# Altium footprint library 7-Connectors-12.PcbLib: 76 footprints (part 2 of 5) (continued)
## DIPS28-600 [mm] "DIP Socket 28 Leads, Row Spacing 15.24mm; Pitch 2.54mm"
height 4.2
pads (28):
  rect 1.5x1.5 hole 0.9: 1(-7.62,16.51)
  round 1.5 hole 0.9: 2(-7.62,13.97) 3(-7.62,11.43) 4(-7.62,8.89) 5(-7.62,6.35) 6(-7.62,3.81) 7(-7.62,1.27) 8(-7.62,-1.27) 9(-7.62,-3.81) 10(-7.62,-6.35) 11(-7.62,-8.89) 12(-7.62,-11.43) 13(-7.62,-13.97) 14(-7.62,-16.51) 15(7.62,-16.51) 16(7.62,-13.97) 17(7.62,-11.43) 18(7.62,-8.89) 19(7.62,-6.35) 20(7.62,-3.81) 21(7.62,-1.27) 22(7.62,1.27) 23(7.62,3.81) 24(7.62,6.35) 25(7.62,8.89) 26(7.62,11.43) 27(7.62,13.97) 28(7.62,16.51)
Top Overlay:
  lines w0.2: -5.14,-17.78 -5.14,17.78 ; -5.14,-14.88 5.36,-14.88 ; -5.14,-1.45 5.36,-1.45 ; -5.14,1.45 5.36,1.45 ; -5.14,14.88 5.36,14.88 ; 5.36,-17.78 5.36,17.78 ; -8.85,-17.78 8.85,-17.78 8.85,17.78 -1.23,17.78 cw(c-2.43,17.78) -3.63,17.78 -8.85,17.78 -8.85,-17.78
Mechanical 8:
  lines w0.1: -8.12,-16.51 -7.62,-16.51 ; -8.12,-13.97 -7.62,-13.97 ; -8.12,-11.43 -7.62,-11.43 ; -8.12,-8.89 -7.62,-8.89 ; -8.12,-6.35 -7.62,-6.35 ; -8.12,-3.81 -7.62,-3.81 ; -8.12,-1.27 -7.62,-1.27 ; -8.12,1.27 -7.62,1.27 ; -8.12,3.81 -7.62,3.81 ; -8.12,6.35 -7.62,6.35 ; -8.12,8.89 -7.62,8.89 ; -8.12,11.43 -7.62,11.43 ; -8.12,13.97 -7.62,13.97 ; -8.12,16.51 -7.62,16.51 ; -7.62,-17.01 -7.62,-16.51 ; -7.62,-16.01 -7.62,-16.51 ; -7.62,-14.47 -7.62,-13.97 ; -7.62,-13.47 -7.62,-13.97 ; -7.62,-11.93 -7.62,-11.43 ; -7.62,-10.93 -7.62,-11.43 ; -7.62,-9.39 -7.62,-8.89 ; -7.62,-8.39 -7.62,-8.89 ; -7.62,-6.85 -7.62,-6.35 ; -7.62,-5.85 -7.62,-6.35 ; -7.62,-4.31 -7.62,-3.81 ; -7.62,-3.31 -7.62,-3.81 ; -7.62,-1.77 -7.62,-1.27 ; -7.62,-0.77 -7.62,-1.27 ; -7.62,0.77 -7.62,1.27 ; -7.62,1.77 -7.62,1.27 ; -7.62,3.31 -7.62,3.81 ; -7.62,4.31 -7.62,3.81 ; -7.62,5.85 -7.62,6.35 ; -7.62,6.85 -7.62,6.35 ; -7.62,8.39 -7.62,8.89 ; -7.62,9.39 -7.62,8.89 ; -7.62,10.93 -7.62,11.43 ; -7.62,11.93 -7.62,11.43 ; -7.62,13.47 -7.62,13.97 ; -7.62,14.47 -7.62,13.97 ; -7.62,16.01 -7.62,16.51 ; -7.62,17.01 -7.62,16.51 ; -7.12,-16.51 -7.62,-16.51 ; -7.12,-13.97 -7.62,-13.97 ; -7.12,-11.43 -7.62,-11.43 ; -7.12,-8.89 -7.62,-8.89 ; -7.12,-6.35 -7.62,-6.35 ; -7.12,-3.81 -7.62,-3.81 ; -7.12,-1.27 -7.62,-1.27 ; -7.12,1.27 -7.62,1.27 ; -7.12,3.81 -7.62,3.81 ; -7.12,6.35 -7.62,6.35 ; -7.12,8.89 -7.62,8.89 ; -7.12,11.43 -7.62,11.43 ; -7.12,13.97 -7.62,13.97 ; -7.12,16.51 -7.62,16.51 ; -0.5,0 0,0 ; 0,-0.5 0,0 ; 0,0.5 0,0 ; 0.5,0 0,0 ; 7.12,-16.51 7.62,-16.51 ; 7.12,-13.97 7.62,-13.97 ; 7.12,-11.43 7.62,-11.43 ; 7.12,-8.89 7.62,-8.89 ; 7.12,-6.35 7.62,-6.35 ; 7.12,-3.81 7.62,-3.81 ; 7.12,-1.27 7.62,-1.27 ; 7.12,1.27 7.62,1.27 ; 7.12,3.81 7.62,3.81 ; 7.12,6.35 7.62,6.35 ; 7.12,8.89 7.62,8.89 ; 7.12,11.43 7.62,11.43 ; 7.12,13.97 7.62,13.97 ; 7.12,16.51 7.62,16.51 ; 7.62,-17.01 7.62,-16.51 ; 7.62,-16.01 7.62,-16.51 ; 7.62,-14.47 7.62,-13.97 ; 7.62,-13.47 7.62,-13.97 ; 7.62,-11.93 7.62,-11.43 ; 7.62,-10.93 7.62,-11.43 ; 7.62,-9.39 7.62,-8.89 ; 7.62,-8.39 7.62,-8.89 ; 7.62,-6.85 7.62,-6.35 ; 7.62,-5.85 7.62,-6.35 ; 7.62,-4.31 7.62,-3.81 ; 7.62,-3.31 7.62,-3.81 ; 7.62,-1.77 7.62,-1.27 ; 7.62,-0.77 7.62,-1.27 ; 7.62,0.77 7.62,1.27 ; 7.62,1.77 7.62,1.27 ; 7.62,3.31 7.62,3.81 ; 7.62,4.31 7.62,3.81 ; 7.62,5.85 7.62,6.35 ; 7.62,6.85 7.62,6.35 ; 7.62,8.39 7.62,8.89 ; 7.62,9.39 7.62,8.89 ; 7.62,10.93 7.62,11.43 ; 7.62,11.93 7.62,11.43 ; 7.62,13.47 7.62,13.97 ; 7.62,14.47 7.62,13.97 ; 7.62,16.01 7.62,16.51 ; 7.62,17.01 7.62,16.51 ; 8.12,-16.51 7.62,-16.51 ; 8.12,-13.97 7.62,-13.97 ; 8.12,-11.43 7.62,-11.43 ; 8.12,-8.89 7.62,-8.89 ; 8.12,-6.35 7.62,-6.35 ; 8.12,-3.81 7.62,-3.81 ; 8.12,-1.27 7.62,-1.27 ; 8.12,1.27 7.62,1.27 ; 8.12,3.81 7.62,3.81 ; 8.12,6.35 7.62,6.35 ; 8.12,8.89 7.62,8.89 ; 8.12,11.43 7.62,11.43 ; 8.12,13.97 7.62,13.97 ; 8.12,16.51 7.62,16.51
Mechanical 14:
  lines w0.1: -5.14,-17.78 -5.14,17.78 ; -5.14,-14.88 5.36,-14.88 ; -5.14,-1.45 5.36,-1.45 ; -5.14,1.45 5.36,1.45 ; -5.14,14.88 5.36,14.88 ; 5.36,-17.78 5.36,17.78 ; -8.85,-17.78 8.85,-17.78 8.85,17.78 -1.23,17.78 cw(c-2.43,17.78) -3.63,17.78 -8.85,17.78 -8.85,-17.78
3D body "DIPS28-600.stp": height 4.2, standoff -3.17, extent -8.85,-17.78 8.85,17.78

## DIPS32-600 [mm] "DIP Socket 28 Leads, Row Spacing 15.24mm; Pitch 2.54mm"
height 4.2
pads (32):
  rect 1.5x1.5 hole 0.9: 1(-7.62,19.05)
  round 1.5 hole 0.9: 2(-7.62,16.51) 3(-7.62,13.97) 4(-7.62,11.43) 5(-7.62,8.89) 6(-7.62,6.35) 7(-7.62,3.81) 8(-7.62,1.27) 9(-7.62,-1.27) 10(-7.62,-3.81) 11(-7.62,-6.35) 12(-7.62,-8.89) 13(-7.62,-11.43) 14(-7.62,-13.97) 15(-7.62,-16.51) 16(-7.62,-19.05) 17(7.62,-19.05) 18(7.62,-16.51) 19(7.62,-13.97) 20(7.62,-11.43) 21(7.62,-8.89) 22(7.62,-6.35) 23(7.62,-3.81) 24(7.62,-1.27) 25(7.62,1.27) 26(7.62,3.81) 27(7.62,6.35) 28(7.62,8.89) 29(7.62,11.43) 30(7.62,13.97) 31(7.62,16.51) 32(7.62,19.05)
Top Overlay:
  lines w0.2: -5.14,-1.45 5.36,-1.45 ; -5.14,1.45 5.36,1.45 ; -5.14,17.42 5.36,17.42 ; -5.14,20.32 -5.14,-17.42 5.36,-17.42 5.36,20.32 ; -8.85,-20.32 8.85,-20.32 8.85,20.32 -1.23,20.32 cw(c-2.43,20.32) -3.63,20.32 -8.85,20.32 -8.85,-20.32
Mechanical 8:
  lines w0.1: -8.12,-19.05 -7.62,-19.05 ; -8.12,-16.51 -7.62,-16.51 ; -8.12,-8.89 -7.62,-8.89 ; -8.12,-6.35 -7.62,-6.35 ; -8.12,-3.81 -7.62,-3.81 ; -8.12,-1.27 -7.62,-1.27 ; -8.12,1.27 -7.62,1.27 ; -8.12,3.81 -7.62,3.81 ; -8.12,6.35 -7.62,6.35 ; -8.12,8.89 -7.62,8.89 ; -8.12,11.43 -7.62,11.43 ; -8.12,13.97 -7.62,13.97 ; -8.12,16.51 -7.62,16.51 ; -8.12,19.05 -7.62,19.05 ; -7.62,-19.55 -7.62,-19.05 ; -7.62,-18.55 -7.62,-19.05 ; -7.62,-17.01 -7.62,-16.51 ; -7.62,-16.01 -7.62,-16.51 ; -7.62,-9.39 -7.62,-8.89 ; -7.62,-8.39 -7.62,-8.89 ; -7.62,-6.85 -7.62,-6.35 ; -7.62,-5.85 -7.62,-6.35 ; -7.62,-4.31 -7.62,-3.81 ; -7.62,-3.31 -7.62,-3.81 ; -7.62,-1.77 -7.62,-1.27 ; -7.62,-0.77 -7.62,-1.27 ; -7.62,0.77 -7.62,1.27 ; -7.62,1.77 -7.62,1.27 ; -7.62,3.31 -7.62,3.81 ; -7.62,4.31 -7.62,3.81 ; -7.62,5.85 -7.62,6.35 ; -7.62,6.85 -7.62,6.35 ; -7.62,8.39 -7.62,8.89 ; -7.62,9.39 -7.62,8.89 ; -7.62,10.93 -7.62,11.43 ; -7.62,11.93 -7.62,11.43 ; -7.62,13.47 -7.62,13.97 ; -7.62,14.47 -7.62,13.97 ; -7.62,16.01 -7.62,16.51 ; -7.62,17.01 -7.62,16.51 ; -7.62,18.55 -7.62,19.05 ; -7.62,19.55 -7.62,19.05 ; -7.12,-19.05 -7.62,-19.05 ; -7.12,-16.51 -7.62,-16.51 ; -7.12,-8.89 -7.62,-8.89 ; -7.12,-6.35 -7.62,-6.35 ; -7.12,-3.81 -7.62,-3.81 ; -7.12,-1.27 -7.62,-1.27 ; -7.12,1.27 -7.62,1.27 ; -7.12,3.81 -7.62,3.81 ; -7.12,6.35 -7.62,6.35 ; -7.12,8.89 -7.62,8.89 ; -7.12,11.43 -7.62,11.43 ; -7.12,13.97 -7.62,13.97 ; -7.12,16.51 -7.62,16.51 ; -7.12,19.05 -7.62,19.05 ; -0.5,0 0,0 ; 0,-0.5 0,0 ; 0,0.5 0,0 ; 0.5,0 0,0 ; 7.12,-19.05 7.62,-19.05 ; 7.12,-16.51 7.62,-16.51 ; 7.12,-13.97 7.62,-13.97 ; 7.12,-11.43 7.62,-11.43 ; 7.12,-8.89 7.62,-8.89 ; 7.12,-6.35 7.62,-6.35 ; 7.12,-3.81 7.62,-3.81 ; 7.12,-1.27 7.62,-1.27 ; 7.12,1.27 7.62,1.27 ; 7.12,3.81 7.62,3.81 ; 7.12,6.35 7.62,6.35 ; 7.12,8.89 7.62,8.89 ; 7.12,11.43 7.62,11.43 ; 7.12,13.97 7.62,13.97 ; 7.12,16.51 7.62,16.51 ; 7.12,19.05 7.62,19.05 ; 7.62,-19.55 7.62,-19.05 ; 7.62,-18.55 7.62,-19.05 ; 7.62,-17.01 7.62,-16.51 ; 7.62,-16.01 7.62,-16.51 ; 7.62,-14.47 7.62,-13.97 ; 7.62,-13.47 7.62,-13.97 ; 7.62,-11.93 7.62,-11.43 ; 7.62,-10.93 7.62,-11.43 ; 7.62,-9.39 7.62,-8.89 ; 7.62,-8.39 7.62,-8.89 ; 7.62,-6.85 7.62,-6.35 ; 7.62,-5.85 7.62,-6.35 ; 7.62,-4.31 7.62,-3.81 ; 7.62,-3.31 7.62,-3.81 ; 7.62,-1.77 7.62,-1.27 ; 7.62,-0.77 7.62,-1.27 ; 7.62,0.77 7.62,1.27 ; 7.62,1.77 7.62,1.27 ; 7.62,3.31 7.62,3.81 ; 7.62,4.31 7.62,3.81 ; 7.62,5.85 7.62,6.35 ; 7.62,6.85 7.62,6.35 ; 7.62,8.39 7.62,8.89 ; 7.62,9.39 7.62,8.89 ; 7.62,10.93 7.62,11.43 ; 7.62,11.93 7.62,11.43 ; 7.62,13.47 7.62,13.97 ; 7.62,14.47 7.62,13.97 ; 7.62,16.01 7.62,16.51 ; 7.62,17.01 7.62,16.51 ; 7.62,18.55 7.62,19.05 ; 7.62,19.55 7.62,19.05 ; 8.12,-19.05 7.62,-19.05 ; 8.12,-16.51 7.62,-16.51 ; 8.12,-13.97 7.62,-13.97 ; 8.12,-11.43 7.62,-11.43 ; 8.12,-8.89 7.62,-8.89 ; 8.12,-6.35 7.62,-6.35 ; 8.12,-3.81 7.62,-3.81 ; 8.12,-1.27 7.62,-1.27 ; 8.12,1.27 7.62,1.27 ; 8.12,3.81 7.62,3.81 ; 8.12,6.35 7.62,6.35 ; 8.12,8.89 7.62,8.89 ; 8.12,11.43 7.62,11.43 ; 8.12,13.97 7.62,13.97 ; 8.12,16.51 7.62,16.51 ; 8.12,19.05 7.62,19.05
Mechanical 14:
  lines w0.1: -5.14,-1.45 5.36,-1.45 ; -5.14,1.45 5.36,1.45 ; -5.14,17.42 5.36,17.42 ; -5.14,20.32 -5.14,-17.42 5.36,-17.42 5.36,20.32 ; -8.85,-20.32 8.85,-20.32 8.85,20.32 -1.23,20.32 cw(c-2.43,20.32) -3.63,20.32 -8.85,20.32 -8.85,-20.32
3D body "DIPS32-600.stp": height 4.2, standoff -3.17, extent -8.85,-20.32 8.85,20.32

## DIPS40-600 [mm] "DIP Socket 40 Leads, Row Spacing 15.24mm; Pitch 2.54mm"
height 4.2
pads (40):
  rect 1.5x1.5 hole 0.9: 1(-7.62,24.13)
  round 1.5 hole 0.9: 2(-7.62,21.59) 3(-7.62,19.05) 4(-7.62,16.51) 5(-7.62,13.97) 6(-7.62,11.43) 7(-7.62,8.89) 8(-7.62,6.35) 9(-7.62,3.81) 10(-7.62,1.27) 11(-7.62,-1.27) 12(-7.62,-3.81) 13(-7.62,-6.35) 14(-7.62,-8.89) 15(-7.62,-11.43) 16(-7.62,-13.97) 17(-7.62,-16.51) 18(-7.62,-19.05) 19(-7.62,-21.59) 20(-7.62,-24.13) 21(7.62,-24.13) 22(7.62,-21.59) 23(7.62,-19.05) 24(7.62,-16.51) 25(7.62,-13.97) 26(7.62,-11.43) 27(7.62,-8.89) 28(7.62,-6.35) 29(7.62,-3.81) 30(7.62,-1.27) 31(7.62,1.27) 32(7.62,3.81) 33(7.62,6.35) 34(7.62,8.89) 35(7.62,11.43) 36(7.62,13.97) 37(7.62,16.51) 38(7.62,19.05) 39(7.62,21.59) 40(7.62,24.13)
Top Overlay:
  lines w0.2: -5.14,-25.4 -5.14,25.4 ; -5.14,-22.5 5.36,-22.5 ; -5.14,-9.07 5.36,-9.07 ; -5.14,-6.17 5.36,-6.17 ; -5.14,7.26 5.36,7.26 ; -5.14,10.16 5.36,10.16 ; -5.14,22.5 5.36,22.5 ; 5.36,-25.4 5.36,25.4 ; -8.85,-25.4 -8.85,25.4 -3.85,25.4 ccw(c-2.65,25.4) -1.45,25.4 8.85,25.4 8.85,-25.4 -8.85,-25.4
Mechanical 8:
  drawing of 164 lines, arcs and shapes, not listed
Mechanical 14:
  lines w0.1: -5.14,-25.4 -5.14,25.4 ; -5.14,-22.5 5.36,-22.5 ; -5.14,-9.07 5.36,-9.07 ; -5.14,-6.17 5.36,-6.17 ; -5.14,7.26 5.36,7.26 ; -5.14,10.16 5.36,10.16 ; -5.14,22.5 5.36,22.5 ; 5.36,-25.4 5.36,25.4 ; -8.85,-25.4 -8.85,25.4 -3.85,25.4 ccw(c-2.65,25.4) -1.45,25.4 8.85,25.4 8.85,-25.4 -8.85,-25.4
3D body "DIPS40-600.stp": height 4.2, standoff -3.17, extent -8.85,-25.4 8.85,25.4

## ERNI_214013 [mm] "6 Contacts, 1.27mm SRC Type A, Single Row Right Angle Male Connector, MiniBridge Cable System"
height 2.98
pads (12):
  rect 0.8x1.4 smd: 1(3.175,0) 2(1.905,0) 3(0.635,0) 4(-0.635,0) 5(-1.905,0) 6(-3.175,0)
  rect 1.2x2.4 smd: Mec1(-5.685,-0.55) Mec2(-5.685,-5.55) Mec3(5.685,-0.55) Mec4(5.685,-5.55)
  round 1 hole 1.6 unplated mask+0.3: Mec5(-5.385,-3.05) Mec6(5.385,-3.05)
Top Overlay:
  circle w0.25: c3.15,1.25 r0.125
  lines w0.2: -6.35,-3.95 -6.35,-2.15 ; -4.685,-6.65 4.685,-6.65 ; -4.685,-0.05 -3.975,-0.05 ; 3.975,-0.05 4.685,-0.05 ; 6.35,-3.95 6.35,-2.1
Mechanical 8:
  circle w0.1: c-5.385,-3.05 r0.8
  circle w0.1: c5.385,-3.05 r0.8
  lines w0.1: -6.185,-5.55 -5.685,-5.55 ; -6.185,-0.55 -5.685,-0.55 ; -5.885,-3.05 -5.385,-3.05 ; -5.685,-6.05 -5.685,-5.55 ; -5.685,-5.05 -5.685,-5.55 ; -5.685,-1.05 -5.685,-0.55 ; -5.685,-0.05 -5.685,-0.55 ; -5.385,-3.55 -5.385,-3.05 ; -5.385,-2.55 -5.385,-3.05 ; -5.185,-5.55 -5.685,-5.55 ; -5.185,-0.55 -5.685,-0.55 ; -4.885,-3.05 -5.385,-3.05 ; -3.675,0 -3.175,0 ; -3.175,-0.5 -3.175,0 ; -3.175,0.5 -3.175,0 ; -2.675,0 -3.175,0 ; -2.405,0 -1.905,0 ; -1.905,-0.5 -1.905,0 ; -1.905,0.5 -1.905,0 ; -1.405,0 -1.905,0 ; -1.135,0 -0.635,0 ; -0.635,-0.5 -0.635,0 ; -0.635,0.5 -0.635,0 ; -0.5,0 0,0 ; 0,-0.5 0,0 ; 0,0.5 0,0 ; 0.5,0 0,0 ; 0.635,-0.5 0.635,0 ; 0.635,0.5 0.635,0 ; 1.135,0 0.635,0 ; 1.405,0 1.905,0 ; 1.905,-0.5 1.905,0 ; 1.905,0.5 1.905,0 ; 2.405,0 1.905,0 ; 2.675,0 3.175,0 ; 3.175,-0.5 3.175,0 ; 3.175,0.5 3.175,0 ; 3.675,0 3.175,0 ; 4.885,-3.05 5.385,-3.05 ; 5.185,-5.55 5.685,-5.55 ; 5.185,-0.55 5.685,-0.55 ; 5.385,-3.55 5.385,-3.05 ; 5.385,-2.55 5.385,-3.05 ; 5.685,-6.05 5.685,-5.55 ; 5.685,-5.05 5.685,-5.55 ; 5.685,-1.05 5.685,-0.55 ; 5.685,-0.05 5.685,-0.55 ; 5.885,-3.05 5.385,-3.05 ; 6.185,-5.55 5.685,-5.55 ; 6.185,-0.55 5.685,-0.55 ; -6.285,-6.75 -5.085,-6.75 -5.085,-4.35 -6.285,-4.35 -6.285,-6.75 ; -6.285,-1.75 -5.085,-1.75 -5.085,0.65 -6.285,0.65 -6.285,-1.75 ; -3.575,-0.7 -3.575,0.7 -2.775,0.7 -2.775,-0.7 -3.575,-0.7 ; 2.775,-0.7 2.775,0.7 3.575,0.7 3.575,-0.7 2.775,-0.7 ; 5.085,-6.75 6.285,-6.75 6.285,-4.35 5.085,-4.35 5.085,-6.75 ; 5.085,-1.75 5.085,0.65 6.285,0.65 6.285,-1.75 5.085,-1.75
Mechanical 14:
  lines w0.1: -6.203,-4.55 -6.35,-4.55 -6.35,-1.55 -6.196,-1.55 ; -6.2,-5.1 -5.5,-5.1 -5.5,-1 -6.2,-1 ; -5.9,-6.18 -6.2,-6.18 -6.2,-6.65 -5.9,-6.65 ; -5.9,-5.93 -6.2,-5.93 -6.2,-0.17 -5.9,-0.17 ; -5.9,-5.1 -5.9,-6.65 ; -5.9,-1 -5.9,-0.05 5.9,-0.05 5.9,-1 ; -5.85,-0.05 -5.85,0.08 -6.2,0.08 -6.2,0.55 -5.2,0.55 -5.2,-0.05 ; -5.3,-6.65 -5.3,-0.05 ; -3.64,-0.05 -3.64,0.55 -3.02,0.55 cw(c-3.02,0.45) -2.92,0.45 -2.92,-0.05 ; -3.49,-0.05 -3.49,0.55 ; -2.37,-0.05 -2.37,0.55 -1.75,0.55 cw(c-1.75,0.45) -1.65,0.45 -1.65,-0.05 ; -2.22,-0.05 -2.22,0.55 ; -1.1,-0.05 -1.1,0.55 -0.48,0.55 cw(c-0.48,0.45) -0.38,0.45 -0.38,-0.05 ; -0.95,-0.05 -0.95,0.55 ; 0.17,-0.05 0.17,0.55 0.79,0.55 cw(c0.79,0.45) 0.89,0.45 0.89,-0.05 ; 0.32,-0.05 0.32,0.55 ; 1.44,-0.05 1.44,0.55 2.06,0.55 cw(c2.06,0.45) 2.16,0.45 2.16,-0.05 ; 1.59,-0.05 1.59,0.55 ; 2.71,-0.05 2.71,0.55 3.33,0.55 cw(c3.33,0.45) 3.43,0.45 3.43,-0.05 ; 2.86,-0.05 2.86,0.55 ; 5.2,-0.05 5.2,0.55 6.2,0.55 6.2,0.08 5.85,0.08 5.85,-0.05 ; 5.3,-6.65 5.3,-0.05 ; 5.9,-6.18 6.2,-6.18 6.2,-6.65 5.9,-6.65 ; 5.9,-5.93 6.2,-5.93 6.2,-0.17 5.9,-0.17 ; 5.9,-5.1 5.9,-6.65 ; 6.196,-1.55 6.35,-1.55 6.35,-4.55 6.203,-4.55 ; 6.2,-5.1 5.5,-5.1 5.5,-1 6.2,-1 ; -5.9,-6.65 5.9,-6.65
Mechanical 15:
  lines w0.05: -6.604,-7.004 -6.604,0.954 6.604,0.954 6.604,-7.004 -6.604,-7.004
3D body "ERNI_214013.stp": height 2.98, standoff -0.75, extent -6.35,-6.65 6.35,0.55

## ERNI_254273 [mm] "12 Contacts Pitch 1.27  SMC Right Angle Male Connector Type B"
height 4.2
pads (18):
  rect 0.8x0.8 smd: A1(3.175,-0.635) A2(1.905,-0.635) A3(0.635,-0.635) A4(-0.635,-0.635) A5(-1.905,-0.635) A6(-3.175,-0.635) B1(3.175,0.635) B2(1.905,0.635) B3(0.635,0.635) B4(-0.635,0.635) B5(-1.905,0.635) B6(-3.175,0.635)
  rect 1.2x2.7 smd: Mec1(-5.685,-0.285) Mec2(-5.685,-5.185) Mec3(5.685,-0.285) Mec4(5.685,-5.185)
  round 1 hole 1.6 unplated mask+0.3: Mec5(-5.385,-2.635) Mec6(5.385,-2.635)
Top Overlay:
  circle w0.25: c3.175,1.651 r0.125
  lines w0.2: -5.185,-6.935 -5.185,-9.035 5.185,-9.035 5.185,-6.935 ; -4.685,-0.235 -3.975,-0.235 ; 3.975,-0.235 4.685,-0.235
  text "6" at -3.845,0.3 h1
  text "a" at 4.8,-1.2 h1
  text "b" at 4.855,0.5 h1
Mechanical 8:
  circle w0.1: c-5.385,-2.635 r0.8
  circle w0.1: c5.385,-2.635 r0.8
  lines w0.1: -6.185,-5.185 -5.685,-5.185 ; -6.185,-0.285 -5.685,-0.285 ; -5.885,-2.635 -5.385,-2.635 ; -5.685,-5.685 -5.685,-5.185 ; -5.685,-4.685 -5.685,-5.185 ; -5.685,-0.785 -5.685,-0.285 ; -5.685,0.215 -5.685,-0.285 ; -5.385,-3.135 -5.385,-2.635 ; -5.385,-2.135 -5.385,-2.635 ; -5.185,-5.185 -5.685,-5.185 ; -5.185,-0.285 -5.685,-0.285 ; -4.885,-2.635 -5.385,-2.635 ; -3.675,-0.635 -3.175,-0.635 ; -3.675,0.635 -3.175,0.635 ; -3.175,-1.135 -3.175,-0.635 ; -3.175,-0.135 -3.175,-0.635 ; -3.175,0.135 -3.175,0.635 ; -3.175,1.135 -3.175,0.635 ; -2.675,-0.635 -3.175,-0.635 ; -2.675,0.635 -3.175,0.635 ; -2.405,-0.635 -1.905,-0.635 ; -2.405,0.635 -1.905,0.635 ; -1.905,-1.135 -1.905,-0.635 ; -1.905,-0.135 -1.905,-0.635 ; -1.905,0.135 -1.905,0.635 ; -1.905,1.135 -1.905,0.635 ; -1.405,-0.635 -1.905,-0.635 ; -1.405,0.635 -1.905,0.635 ; -1.135,-0.635 -0.635,-0.635 ; -1.135,0.635 -0.635,0.635 ; -0.635,-1.135 -0.635,-0.635 ; -0.635,-0.135 -0.635,-0.635 ; -0.635,0.135 -0.635,0.635 ; -0.635,1.135 -0.635,0.635 ; -0.5,0 0,0 ; -0.135,-0.635 -0.635,-0.635 ; -0.135,0.635 -0.635,0.635 ; 0,-0.5 0,0 ; 0,0.5 0,0 ; 0.135,-0.635 0.635,-0.635 ; 0.135,0.635 0.635,0.635 ; 0.5,0 0,0 ; 0.635,-1.135 0.635,-0.635 ; 0.635,-0.135 0.635,-0.635 ; 0.635,0.135 0.635,0.635 ; 0.635,1.135 0.635,0.635 ; 1.135,-0.635 0.635,-0.635 ; 1.135,0.635 0.635,0.635 ; 1.405,-0.635 1.905,-0.635 ; 1.405,0.635 1.905,0.635 ; 1.905,-1.135 1.905,-0.635 ; 1.905,-0.135 1.905,-0.635 ; 1.905,0.135 1.905,0.635 ; 1.905,1.135 1.905,0.635 ; 2.405,-0.635 1.905,-0.635 ; 2.405,0.635 1.905,0.635 ; 2.675,-0.635 3.175,-0.635 ; 2.675,0.635 3.175,0.635 ; 3.175,-1.135 3.175,-0.635 ; 3.175,-0.135 3.175,-0.635 ; 3.175,0.135 3.175,0.635 ; 3.175,1.135 3.175,0.635 ; 3.675,-0.635 3.175,-0.635 ; 3.675,0.635 3.175,0.635 ; 4.885,-2.635 5.385,-2.635 ; 5.185,-5.185 5.685,-5.185 ; 5.185,-0.285 5.685,-0.285 ; 5.385,-3.135 5.385,-2.635 ; 5.385,-2.135 5.385,-2.635 ; 5.685,-5.685 5.685,-5.185 ; 5.685,-4.685 5.685,-5.185 ; 5.685,-0.785 5.685,-0.285 ; 5.685,0.215 5.685,-0.285 ; 5.885,-2.635 5.385,-2.635 ; 6.185,-5.185 5.685,-5.185 ; 6.185,-0.285 5.685,-0.285 ; -6.285,-6.535 -5.085,-6.535 -5.085,-3.835 -6.285,-3.835 -6.285,-6.535 ; -6.285,-1.635 -6.285,1.065 -5.085,1.065 -5.085,-1.635 -6.285,-1.635 ; -3.575,-1.035 -2.775,-1.035 -2.775,-0.235 -3.575,-0.235 -3.575,-1.035 ; -3.575,0.235 -2.775,0.235 -2.775,1.035 -3.575,1.035 -3.575,0.235 ; -2.305,-1.035 -1.505,-1.035 -1.505,-0.235 -2.305,-0.235 -2.305,-1.035 ; -2.305,0.235 -1.505,0.235 -1.505,1.035 -2.305,1.035 -2.305,0.235 ; -1.035,-1.035 -0.235,-1.035 -0.235,-0.235 -1.035,-0.235 -1.035,-1.035 ; -1.035,0.235 -0.235,0.235 -0.235,1.035 -1.035,1.035 -1.035,0.235 ; 0.235,-1.035 1.035,-1.035 1.035,-0.235 0.235,-0.235 0.235,-1.035 ; 0.235,0.235 1.035,0.235 1.035,1.035 0.235,1.035 0.235,0.235 ; 1.505,-1.035 2.305,-1.035 2.305,-0.235 1.505,-0.235 1.505,-1.035 ; 1.505,0.235 2.305,0.235 2.305,1.035 1.505,1.035 1.505,0.235 ; 2.775,-1.035 3.575,-1.035 3.575,-0.235 2.775,-0.235 2.775,-1.035 ; 2.775,0.235 3.575,0.235 3.575,1.035 2.775,1.035 2.775,0.235 ; 5.085,-6.535 6.285,-6.535 6.285,-3.835 5.085,-3.835 5.085,-6.535 ; 5.085,-1.635 5.085,1.065 6.285,1.065 6.285,-1.635 5.085,-1.635
Mechanical 14:
  drawing of 628 lines, arcs and shapes, not listed
  text "6" at -3.845,0.3 h1
  text "a6" at -4,-2.8 h1
  text "a1" at 2.7,-2.8 h1
  text "b" at 4.855,0.5 h1
  text "a" at 4.8,-1.2 h1
3D body "ERNI_254273.stp": height 4.25, standoff -0.75, extent -6.35,-9.035 6.35,0.965

## FCI_54602-908LF [mm] "1 Port, 8 Positions, CAT3 RJ45 Horizontal Modular Jack"
height 10
pads (10):
  round 1.4 hole 0.7: 1(4.445,1.27) 2(3.175,-1.27) 3(1.905,1.27) 4(0.635,-1.27) 5(-0.635,1.27) 6(-1.905,-1.27) 7(-3.171,1.27) 8(-4.445,-1.27)
  round 1 hole 3.2 unplated mask+1.1: M1(-5.715,7.62) M2(5.715,7.62)
Top Overlay:
  lines w0.2: -6.6,-2.46 -6.6,-2.5 6.6,-2.5 6.6,-2.46 ; -7.65,-2.46 7.65,-2.46 7.65,15.24 -7.65,15.24 -7.65,-2.46
  text "1" at 6.03,0.6 h1.2
Mechanical 8:
  circle w0.1: c5.715,7.62 r1.6
  circle w0.1: c-5.715,7.62 r1.6
  circle w0.1: c4.445,1.27 r0.415
  circle w0.1: c-3.175,1.27 r0.415
  circle w0.1: c-4.445,-1.27 r0.415
  circle w0.1: c3.175,-1.27 r0.415
  lines w0.1: -6.215,7.62 -5.715,7.62 ; -5.715,7.12 -5.715,7.62 ; -5.715,8.12 -5.715,7.62 ; -5.215,7.62 -5.715,7.62 ; -4.945,-1.27 -4.445,-1.27 ; -4.445,-1.77 -4.445,-1.27 ; -4.445,-0.77 -4.445,-1.27 ; -3.945,-1.27 -4.445,-1.27 ; -3.675,1.27 -3.175,1.27 ; -3.175,0.77 -3.175,1.27 ; -3.175,1.77 -3.175,1.27 ; -2.675,1.27 -3.175,1.27 ; -2.405,-1.27 -1.905,-1.27 ; -1.905,-1.77 -1.905,-1.27 ; -1.905,-0.77 -1.905,-1.27 ; -1.405,-1.27 -1.905,-1.27 ; -1.135,1.27 -0.635,1.27 ; -0.635,0.77 -0.635,1.27 ; -0.635,1.77 -0.635,1.27 ; -0.5,0 0,0 ; -0.135,1.27 -0.635,1.27 ; 0,-0.5 0,0 ; 0,0.5 0,0 ; 0.135,-1.27 0.635,-1.27 ; 0.5,0 0,0 ; 0.635,-1.77 0.635,-1.27 ; 0.635,-0.77 0.635,-1.27 ; 1.135,-1.27 0.635,-1.27 ; 1.405,1.27 1.905,1.27 ; 1.905,0.77 1.905,1.27 ; 1.905,1.77 1.905,1.27 ; 2.405,1.27 1.905,1.27 ; 2.675,-1.27 3.175,-1.27 ; 3.175,-1.77 3.175,-1.27 ; 3.175,-0.77 3.175,-1.27 ; 3.675,-1.27 3.175,-1.27 ; 3.945,1.27 4.445,1.27 ; 4.445,0.77 4.445,1.27 ; 4.445,1.77 4.445,1.27 ; 4.945,1.27 4.445,1.27 ; 5.215,7.62 5.715,7.62 ; 5.715,7.12 5.715,7.62 ; 5.715,8.12 5.715,7.62 ; 6.215,7.62 5.715,7.62
Mechanical 14:
  lines w0.1: -6.6,-2.46 -6.6,-2.5 6.6,-2.5 6.6,-2.46 ; -7.65,-2.46 7.65,-2.46 7.65,15.24 -7.65,15.24 -7.65,-2.46
  text "1" at 6.03,0.6 h1.2
3D body "FCI_54602-908LF.stp": height 12.7, standoff -3.5, extent -7.65,-2.5 7.65,15.24

## FCI_72309-8034BLF [mm] "Dual USB Type A 4 Pin Receptacle, Right Angle, Shielded"
height 15.5
pads (12):
  round 1.6 hole 0.9: A1(-3.5,1.31) A2(-1,1.31) A3(1,1.31) A4(3.5,1.31) B1(-3.5,-1.31) B2(-1,-1.31) B3(1,-1.31) B4(3.5,-1.31)
  round 3 hole 2.3: SH(-6.57,-4.02) SH(-6.57,1.66) SH(6.57,-4.02) SH(6.57,1.66)
Top Overlay:
  circle w0.5: c-3.525,3.525 r0.25
  lines w0.2: -6.555,-14.214 -6.555,-14.3 ccw(c-5.95,-14.3) -5.973,-14.905 -0.78,-15.1 ccw(c-0.755,-14.433) -0.305,-14.925 -0.511,-14.7 cw(c-0.755,-14.433) -0.769,-14.795 -5.961,-14.6 cw(c-5.95,-14.3) -6.25,-14.3 -6.25,-13.68 cw(c-6.87,-13.68) -6.87,-14.3 -7.25,-14.301 -7.25,-13.995 -6.87,-13.995 ccw(c-6.87,-13.68) -6.555,-13.68 ; -6.555,-5.82 -6.555,-13.68 ; -6.555,-2.22 -6.555,-0.14 ; -6.2,-13.68 -6.2,-14.3 6.2,-14.3 6.2,-13.68 ; -5.6,-14.3 -5.6,-13.68 ; -5.6,-13.995 5.6,-13.995 ; -5.102,2.701 5.086,2.7 ; -4.094,-13.68 -6.555,-13.68 ; -4.085,-13.724 -4.602,-6.88 -4,-6.88 -3.55,-12.84 -2.45,-12.84 -2,-6.88 -1.398,-6.88 -1.915,-13.73 -4.085,-13.73 ; 0.755,-14.795 5.961,-14.6 ccw(c5.95,-14.3) 6.25,-14.3 6.25,-13.68 ccw(c6.87,-13.68) 6.87,-14.3 7.25,-14.3 7.25,-13.995 6.87,-13.995 cw(c6.87,-13.68) 6.555,-13.68 ; 0.769,-14.795 cw(c0.755,-14.433) 0.511,-14.7 0.305,-14.925 ccw(c0.755,-14.433) 0.78,-15.1 5.973,-14.905 ccw(c5.95,-14.3) 6.555,-14.3 6.555,-14.214 ; 1.915,-13.73 4.085,-13.73 4.602,-6.88 4,-6.88 3.55,-12.84 2.45,-12.84 2,-6.88 1.398,-6.88 1.915,-13.724 ; 4.088,-13.68 6.555,-13.68 ; 5.6,-14.3 5.6,-13.68 ; 6.555,-5.82 6.555,-13.68 ; 6.555,-2.22 6.555,-0.14
  text "B" at -5.613,-1.75 h1
  text "1" at -3.685,-3.5 h1
  text "4" at 3.148,-3.5 h1
Mechanical 8:
  lines w0.1: -7.07,-4.02 -6.57,-4.02 ; -7.07,1.66 -6.57,1.66 ; -6.57,-4.52 -6.57,-4.02 ; -6.57,-3.52 -6.57,-4.02 ; -6.57,1.16 -6.57,1.66 ; -6.57,2.16 -6.57,1.66 ; -6.07,-4.02 -6.57,-4.02 ; -6.07,1.66 -6.57,1.66 ; -4,-1.31 -3.5,-1.31 ; -4,1.31 -3.5,1.31 ; -3.5,-1.81 -3.5,-1.31 ; -3.5,-0.81 -3.5,-1.31 ; -3.5,0.81 -3.5,1.31 ; -3.5,1.81 -3.5,1.31 ; -3,-1.31 -3.5,-1.31 ; -3,1.31 -3.5,1.31 ; -1.5,-1.31 -1,-1.31 ; -1.5,1.31 -1,1.31 ; -1,-1.81 -1,-1.31 ; -1,-0.81 -1,-1.31 ; -1,0.81 -1,1.31 ; -1,1.81 -1,1.31 ; -0.5,-1.31 -1,-1.31 ; -0.5,0 0,0 ; -0.5,1.31 -1,1.31 ; 0,-0.5 0,0 ; 0,0.5 0,0 ; 0.5,-1.31 1,-1.31 ; 0.5,0 0,0 ; 0.5,1.31 1,1.31 ; 1,-1.81 1,-1.31 ; 1,-0.81 1,-1.31 ; 1,0.81 1,1.31 ; 1,1.81 1,1.31 ; 1.5,-1.31 1,-1.31 ; 1.5,1.31 1,1.31 ; 3,-1.31 3.5,-1.31 ; 3,1.31 3.5,1.31 ; 3.5,-1.81 3.5,-1.31 ; 3.5,-0.81 3.5,-1.31 ; 3.5,0.81 3.5,1.31 ; 3.5,1.81 3.5,1.31 ; 4,-1.31 3.5,-1.31 ; 4,1.31 3.5,1.31 ; 6.07,-4.02 6.57,-4.02 ; 6.07,1.66 6.57,1.66 ; 6.57,-4.52 6.57,-4.02 ; 6.57,-3.52 6.57,-4.02 ; 6.57,1.16 6.57,1.66 ; 6.57,2.16 6.57,1.66 ; 7.07,-4.02 6.57,-4.02 ; 7.07,1.66 6.57,1.66
Mechanical 14:
  lines w0.1: -6.555,-14.214 -6.555,-14.3 ccw(c-5.95,-14.3) -5.973,-14.905 -0.78,-15.1 ccw(c-0.755,-14.433) -0.305,-14.925 -0.511,-14.7 cw(c-0.755,-14.433) -0.769,-14.795 -5.961,-14.6 cw(c-5.95,-14.3) -6.25,-14.3 -6.25,-13.68 cw(c-6.87,-13.68) -6.87,-14.3 -7.25,-14.301 -7.25,-13.995 -6.87,-13.995 ccw(c-6.87,-13.68) -6.555,-13.68 ; -6.555,1 -7.5,1 -7.5,2 -6.555,2 ; -6.555,2.701 6.555,2.7 ; -6.25,2.7 -6.25,2.918 -6.555,2.918 -6.555,-13.68 ; -6.2,-13.68 -6.2,-14.3 6.2,-14.3 6.2,-13.68 ; -5.6,-14.3 -5.6,-13.68 ; -5.6,-13.995 5.6,-13.995 ; -4.094,-13.68 -6.555,-13.68 ; -4.085,-13.724 -4.602,-6.88 -4,-6.88 -3.55,-12.84 -2.45,-12.84 -2,-6.88 -1.398,-6.88 -1.915,-13.73 -4.085,-13.73 ; 0.755,-14.795 5.961,-14.6 ccw(c5.95,-14.3) 6.25,-14.3 6.25,-13.68 ccw(c6.87,-13.68) 6.87,-14.3 7.25,-14.3 7.25,-13.995 6.87,-13.995 cw(c6.87,-13.68) 6.555,-13.68 ; 0.769,-14.795 cw(c0.755,-14.433) 0.511,-14.7 0.305,-14.925 ccw(c0.755,-14.433) 0.78,-15.1 5.973,-14.905 ccw(c5.95,-14.3) 6.555,-14.3 6.555,-14.214 ; 1.915,-13.73 4.085,-13.73 4.602,-6.88 4,-6.88 3.55,-12.84 2.45,-12.84 2,-6.88 1.398,-6.88 1.915,-13.724 ; 4.088,-13.68 6.555,-13.68 ; 5.6,-14.3 5.6,-13.68 ; 6.25,2.7 6.25,2.918 6.555,2.918 6.555,-13.68 ; 6.555,1 7.5,1 7.5,2 6.555,2
  text "B" at -5.613,-1.75 h1
  text "1" at -3.685,-3.5 h1
  text "4" at 3.148,-3.5 h1
3D body "FCI_72309-8034BLF.stp": height 16.19, standoff -2.8, extent -7.5,-15.099 7.5,2.918

## FCI_87520-0010BLF [mm] "USB 2.0 Type A Receptacle, 4 Pins, Right Angle, Shielded"
height 7.7
pads (6):
  round 1.6 hole 0.9: 1(-3.5,0) 2(-1,0) 3(1,0) 4(3.5,0)
  round 2.8 hole 2.3: 5(-6.57,-2.71) 5(6.57,-2.71)
Top Overlay:
  circle w0.5: c-3.515,2 r0.25
  lines w0.2: -6.537,-12.26 6.563,-12.26 ; -6.537,-4.46 -6.537,-12.41 cw(c-6.837,-12.41) -6.837,-12.71 -7.237,-12.71 -7.237,-13.01 -6.837,-13.01 ccw(c-6.837,-12.41) -6.237,-12.41 -6.237,-12.26 ; -6.537,-0.96 -6.537,0.99 -4.075,0.99 ; -5.537,-12.71 5.563,-12.71 ; -5.537,-12.26 -5.537,-13.01 5.563,-13.01 5.563,-12.26 ; 4.101,0.99 6.563,0.99 6.563,-0.96 ; 6.263,-12.26 6.263,-12.41 ccw(c6.863,-12.41) 6.863,-13.01 7.263,-13.01 7.263,-12.71 6.863,-12.71 cw(c6.863,-12.41) 6.563,-12.41 6.563,-4.46
  text "4" at 3.173,-2.5 h1
  text "1" at -3.66,-2.5 h1
Mechanical 8:
  circle w0.1: c6.57,-2.71 r1.15
  circle w0.1: c3.487,0 r0.5
  circle w0.1: c-3.5,0 r0.5
  circle w0.1: c1,0 r0.5
  circle w0.1: c-1.013,0 r0.5
  circle w0.1: c-6.57,-2.71 r1.15
  lines w0.1: -7.57,-2.71 -6.57,-2.71 ; -6.57,-3.71 -6.57,-2.71 ; -6.537,-9 6.563,-9 ; -4.5,0 -3.5,0 ; -3.5,-2.71 -3.5,0 ; -3.5,-1 -3.5,0 ; -2,0 -1,0 ; -1,-2.71 -1,0 ; -1,-1 -1,0 ; 0,-2.71 0,0 ; 0.013,-13.01 0.013,0.99 ; 0.013,0 1.013,0 1.013,-1 ; 1,-2.71 1,0 ; 2.5,0 3.5,0 ; 3.5,-2.71 3.5,0 ; 3.5,-1 3.5,0 ; 5.57,-2.71 6.57,-2.71 ; 6.263,-13.01 7.263,-13.01 ; 6.563,-12.71 7.263,-12.71 ; 6.57,-3.71 6.57,-2.71 ; -6.57,-2.71 6.57,-2.71 ; -3.5,0 3.5,0 ; -3.713,-0.15 -3.713,0.15 -3.313,0.15 -3.313,-0.15 -3.713,-0.15 ; -1.213,-0.15 -1.213,0.15 -0.813,0.15 -0.813,-0.15 -1.213,-0.15 ; 0.8,-0.15 0.8,0.15 1.2,0.15 1.2,-0.15 0.8,-0.15 ; 3.287,-0.15 3.287,0.15 3.687,0.15 3.687,-0.15 3.287,-0.15
Mechanical 14:
  lines w0.1: -6.537,-12.26 6.563,-12.26 ; -6.237,-12.26 -6.237,-12.41 cw(c-6.837,-12.41) -6.837,-13.01 -7.237,-13.01 -7.237,-12.71 -6.837,-12.71 ccw(c-6.837,-12.41) -6.537,-12.41 -6.537,0.99 6.563,0.99 6.563,-12.41 ccw(c6.863,-12.41) 6.863,-12.71 7.263,-12.71 7.263,-13.01 6.863,-13.01 cw(c6.863,-12.41) 6.263,-12.41 6.263,-12.26 ; -5.537,-12.71 5.563,-12.71 ; -5.537,-12.26 -5.537,-13.01 5.563,-13.01 5.563,-12.26
  text "4" at 3.173,-2.5 h1
  text "1" at -3.66,-2.5 h1
3D body "FCI_87520-0010BLF.stp": height 7.55, standoff -3.3, extent -7.9,-13.05 7.9,1.11